# Altium schematic symbol library Microchip PIC16.SchLib: 1803 symbols (part 60 of 63) (continued)
## PIC16LF1847T-I/SS (continued)
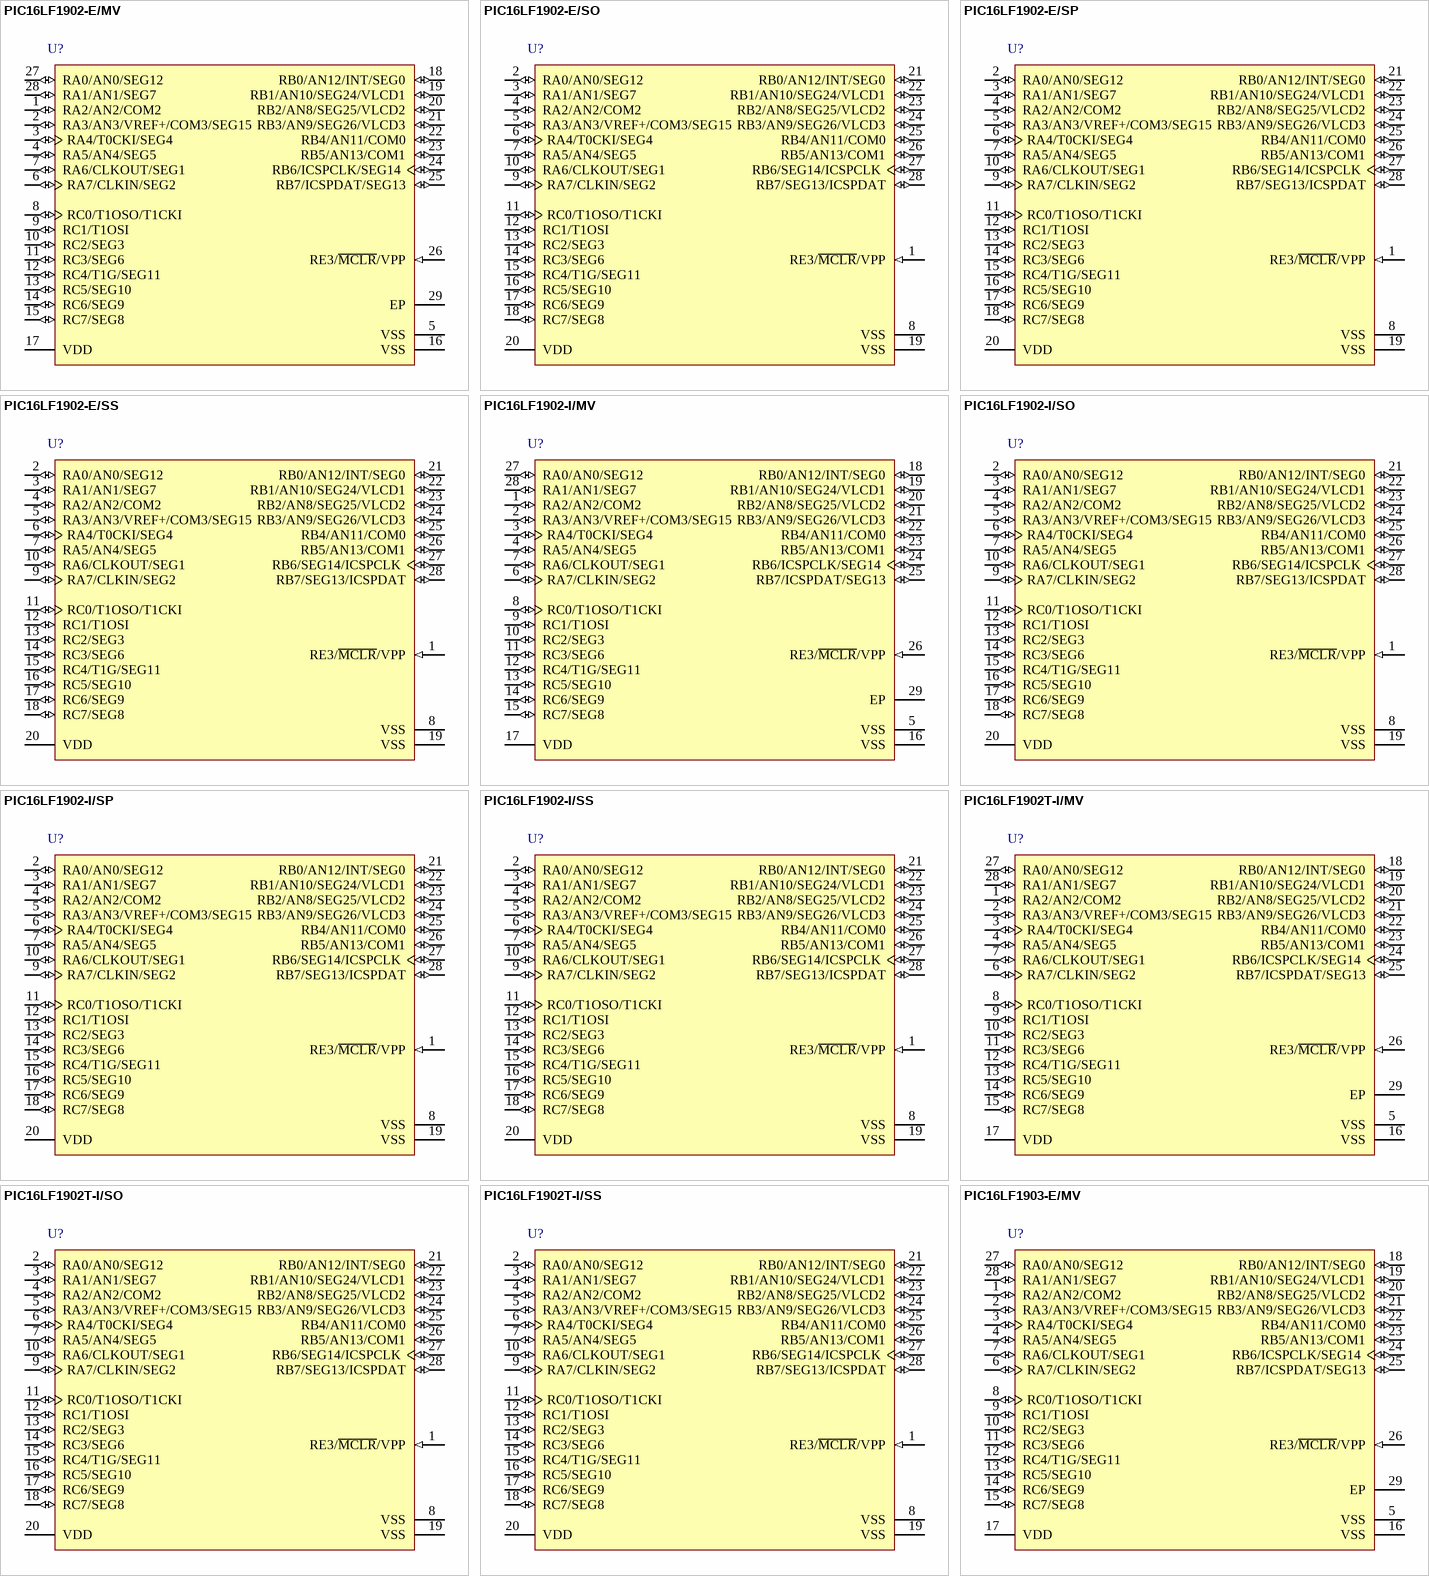
[diagram p94: symbols PIC16LF1902-E/MV to PIC16LF1903-E/MV]

## PIC16LF1902-E/MV
designator U?
Flash-Based, 8-Bit CMOS MCU with LCD Driver and nanoWatt XLP Technology, 20 MHz, 25 I/O, -40 to 125 degC, 28-pin UQFN (MV28), Tube; Manufacturer: Microchip; PartNumber: PIC16LF1902-E/MV; # of A/D Channels: 11; I/O Pins: 25; Internal Oscillator: 16 MHz, 31 kHz; Max. CPU Speed MHz: 20; Memory Type: Flash; Operation Voltage Range: 1.8V - 3.6V; Program Memory KBytes: 3.5; Program Memory KWords: 2; RAM: 128; Timers: 1 - 8-bit, 1 - 16-bit; Populated: Yes; DatasheetVersion: Rev. B; PackageVersion: C04-152A, 04/2013; PackageReference: UQFN-MV28; PackageDescription: 28-Lead Plastic Ultra Thin Quad Flat, Body 4 x 4 mm, Pitch 0.4 mm; Supplier 1: Digi-Key; Supplier Part Number 1: PIC16LF1902-E/MV-ND; Packing: TUBE; RoHS: TRUE; Mounting Technology: Surface Mount; ComponentLink1Description: Datasheet; ComponentLink1URL: http://ww1.microchip.com/downloads/en/DeviceDoc/41455B.pdf; ComponentLink2Description: Package Specification; ComponentLink2URL: http://www.microchip.com/stellent/groups/techpub_sg/documents/packagingspec/en012702.pdf; ComponentLink3Description: URL Link1; ComponentLink3URL: Product URL:http://www.microchip.com/datasheet/PIC16LF1902
footprint MCHP-UQFN-MV28_N (QFN, 28-Leads, Body 4x4mm, Pitch 0.4mm, Thermal Pad 2.65x2.65mm, IPC Medium Density)
footprint MCHP-UQFN-MV28_L (QFN, 28-Leads, Body 4x4mm, Pitch 0.4mm, Thermal Pad 2.65x2.65mm, IPC High Density)
footprint MCHP-UQFN-MV28_M (QFN, 28-Leads, Body 4x4mm, Pitch 0.4mm, Thermal Pad 2.65x2.65mm, IPC Low Density)
pins: 1 RA2/AN2/COM2 (io), 2 RA3/AN3/VREF+/COM3/SEG15 (io), 3 RA4/T0CKI/SEG4 (io), 4 RA5/AN4/SEG5 (io), 5 VSS (power) "Ground reference.", 6 RA7/CLKIN/SEG2 (io), 7 RA6/CLKOUT/SEG1 (io), 8 RC0/T1OSO/T1CKI (io), 9 RC1/T1OSI (io), 10 RC2/SEG3 (io), 11 RC3/SEG6 (io), 12 RC4/T1G/SEG11 (io), 13 RC5/SEG10 (io), 14 RC6/SEG9 (io), 15 RC7/SEG8 (io), 16 VSS (power) "Ground reference.", 17 VDD (power) "Positive supply.", 18 RB0/AN12/INT/SEG0 (io), 19 RB1/AN10/SEG24/VLCD1 (io), 20 RB2/AN8/SEG25/VLCD2 (io), 21 RB3/AN9/SEG26/VLCD3 (io), 22 RB4/AN11/COM0 (io), 23 RB5/AN13/COM1 (io), 24 RB6/ICSPCLK/SEG14 (io), 25 RB7/ICSPDAT/SEG13 (io), 26 RE3/~{MCLR}/VPP (in), 27 RA0/AN0/SEG12 (io), 28 RA1/AN1/SEG7 (io), 29 EP

## PIC16LF1902-E/SO
designator U?
Flash-Based, 8-Bit CMOS MCU with LCD Driver and nanoWatt XLP Technology, 20 MHz, 25 I/O, -40 to 125 degC, 28-pin SOIC (SO28), Tube; Manufacturer: Microchip; PartNumber: PIC16LF1902-E/SO; # of A/D Channels: 11; I/O Pins: 25; Internal Oscillator: 16 MHz, 32 kHz; Max. CPU Speed MHz: 20; Memory Type: Flash; Operation Voltage Range: 1.8V - 3.6V; Program Memory KBytes: 3.5; Program Memory KWords: 2; RAM: 128; Timers: 1 - 8-bit, 1 - 16-bit; Populated: Yes; DatasheetVersion: Rev. B; PackageVersion: C04-052C, 12/2012; PackageReference: SOIC-SO28; PackageDescription: 28-Lead Plastic Small Outline, 17.9 x 7.5 mm Body, 1.27 mm Pitch; Supplier 1: Digi-Key; Supplier Part Number 1: PIC16LF1902-E/SO-ND; Packing: TUBE; RoHS: TRUE; Mounting Technology: Surface Mount; ComponentLink1Description: Datasheet; ComponentLink1URL: http://ww1.microchip.com/downloads/en/DeviceDoc/41455B.pdf; ComponentLink2Description: Package Specification; ComponentLink2URL: http://www.microchip.com/stellent/groups/techpub_sg/documents/packagingspec/en012702.pdf; ComponentLink3Description: URL Link1; ComponentLink3URL: Product URL:http://www.microchip.com/datasheet/PIC16LF1902
footprint MCHP-SOIC-SO28_N (SOIC, 28-Leads, Body 17.9x7.5mm, Pitch 1.27mm, IPC Medium Density)
footprint MCHP-SOIC-SO28_L (SOIC, 28-Leads, Body 17.9x7.5mm, Pitch 1.27mm, IPC High Density)
footprint MCHP-SOIC-SO28_M (SOIC, 28-Leads, Body 17.9x7.5mm, Pitch 1.27mm, IPC Low Density)
pins: 1 RE3/~{MCLR}/VPP (in), 2 RA0/AN0/SEG12 (io), 3 RA1/AN1/SEG7 (io), 4 RA2/AN2/COM2 (io), 5 RA3/AN3/VREF+/COM3/SEG15 (io), 6 RA4/T0CKI/SEG4 (io), 7 RA5/AN4/SEG5 (io), 8 VSS (power) "Ground reference.", 9 RA7/CLKIN/SEG2 (io), 10 RA6/CLKOUT/SEG1 (io), 11 RC0/T1OSO/T1CKI (io), 12 RC1/T1OSI (io), 13 RC2/SEG3 (io), 14 RC3/SEG6 (io), 15 RC4/T1G/SEG11 (io), 16 RC5/SEG10 (io), 17 RC6/SEG9 (io), 18 RC7/SEG8 (io), 19 VSS (power) "Ground reference.", 20 VDD (power) "Positive supply.", 21 RB0/AN12/INT/SEG0 (io), 22 RB1/AN10/SEG24/VLCD1 (io), 23 RB2/AN8/SEG25/VLCD2 (io), 24 RB3/AN9/SEG26/VLCD3 (io), 25 RB4/AN11/COM0 (io), 26 RB5/AN13/COM1 (io), 27 RB6/SEG14/ICSPCLK (io), 28 RB7/SEG13/ICSPDAT (io)

## PIC16LF1902-E/SP
designator U?
Flash-Based, 8-Bit CMOS MCU with LCD Driver and nanoWatt XLP Technology, 20 MHz, 25 I/O, -40 to 125 degC, 28-pin SPDIP (SP28), Tube; Manufacturer: Microchip; PartNumber: PIC16LF1902-E/SP; # of A/D Channels: 11; I/O Pins: 25; Internal Oscillator: 16 MHz, 32 kHz; Max. CPU Speed MHz: 20; Memory Type: Flash; Operation Voltage Range: 1.8V - 3.6V; Program Memory KBytes: 3.5; Program Memory KWords: 2; RAM: 128; Timers: 1 - 8-bit, 1 - 16-bit; Populated: Yes; DatasheetVersion: Rev. B; PackageVersion: C04-070B, 12/2012; PackageReference: SPDIP-SP28; PackageDescription: 28-Lead Plastic Dual In-Line, 34.86 x 6.79 mm Body, 2.54 mm Pitch; Supplier 1: Digi-Key; Supplier Part Number 1: PIC16LF1902-E/SP-ND; Packing: TUBE; RoHS: TRUE; Mounting Technology: Through Hole; ComponentLink1Description: Datasheet; ComponentLink1URL: http://ww1.microchip.com/downloads/en/DeviceDoc/41455B.pdf; ComponentLink2Description: Package Specification; ComponentLink2URL: http://www.microchip.com/stellent/groups/techpub_sg/documents/packagingspec/en012702.pdf; ComponentLink3Description: URL Link1; ComponentLink3URL: Product URL:http://www.microchip.com/datasheet/PIC16LF1902
footprint MCHP-SPDIP-SP28 (DIP, 28-Leads, Body 34.86x6.79mm, Pitch 2.54mm)
pins: 1 RE3/~{MCLR}/VPP (in), 2 RA0/AN0/SEG12 (io), 3 RA1/AN1/SEG7 (io), 4 RA2/AN2/COM2 (io), 5 RA3/AN3/VREF+/COM3/SEG15 (io), 6 RA4/T0CKI/SEG4 (io), 7 RA5/AN4/SEG5 (io), 8 VSS (power) "Ground reference.", 9 RA7/CLKIN/SEG2 (io), 10 RA6/CLKOUT/SEG1 (io), 11 RC0/T1OSO/T1CKI (io), 12 RC1/T1OSI (io), 13 RC2/SEG3 (io), 14 RC3/SEG6 (io), 15 RC4/T1G/SEG11 (io), 16 RC5/SEG10 (io), 17 RC6/SEG9 (io), 18 RC7/SEG8 (io), 19 VSS (power) "Ground reference.", 20 VDD (power) "Positive supply.", 21 RB0/AN12/INT/SEG0 (io), 22 RB1/AN10/SEG24/VLCD1 (io), 23 RB2/AN8/SEG25/VLCD2 (io), 24 RB3/AN9/SEG26/VLCD3 (io), 25 RB4/AN11/COM0 (io), 26 RB5/AN13/COM1 (io), 27 RB6/SEG14/ICSPCLK (io), 28 RB7/SEG13/ICSPDAT (io)

## PIC16LF1902-E/SS
designator U?
Flash-Based, 8-Bit CMOS MCU with LCD Driver and nanoWatt XLP Technology, 20 MHz, 25 I/O, -40 to 125 degC, 28-pin SSOP (SS28), Tube; Manufacturer: Microchip; PartNumber: PIC16LF1902-E/SS; # of A/D Channels: 11; I/O Pins: 25; Internal Oscillator: 16 MHz, 32 kHz; Max. CPU Speed MHz: 20; Memory Type: Flash; Operation Voltage Range: 1.8V - 3.6V; Program Memory KBytes: 3.5; Program Memory KWords: 2; RAM: 128; Timers: 1 - 8-bit, 1 - 16-bit; Populated: Yes; DatasheetVersion: Rev. B; PackageVersion: C04-073B, 12/2012; PackageReference: SSOP-SS28; PackageDescription: 28-Lead Plastic Shrink Small Outline, 10.2 x 5.3 mm Body, 0.65 mm Pitch; Supplier 1: Digi-Key; Supplier Part Number 1: PIC16LF1902-E/SS-ND; Packing: TUBE; RoHS: TRUE; Mounting Technology: Surface Mount; ComponentLink1Description: Datasheet; ComponentLink1URL: http://ww1.microchip.com/downloads/en/DeviceDoc/41455B.pdf; ComponentLink2Description: Package Specification; ComponentLink2URL: http://www.microchip.com/stellent/groups/techpub_sg/documents/packagingspec/en012702.pdf; ComponentLink3Description: URL Link1; ComponentLink3URL: Product URL:http://www.microchip.com/datasheet/PIC16LF1902
footprint MCHP-SSOP-SS28_N (SOP, 28-Leads, Body 10.2x5.3mm, Pitch 0.65mm, IPC Medium Density)
footprint MCHP-SSOP-SS28_L (SOP, 28-Leads, Body 10.2x5.3mm, Pitch 0.65mm, IPC High Density)
footprint MCHP-SSOP-SS28_M (SOP, 28-Leads, Body 10.2x5.3mm, Pitch 0.65mm, IPC Low Density)
pins: 1 RE3/~{MCLR}/VPP (in), 2 RA0/AN0/SEG12 (io), 3 RA1/AN1/SEG7 (io), 4 RA2/AN2/COM2 (io), 5 RA3/AN3/VREF+/COM3/SEG15 (io), 6 RA4/T0CKI/SEG4 (io), 7 RA5/AN4/SEG5 (io), 8 VSS (power) "Ground reference.", 9 RA7/CLKIN/SEG2 (io), 10 RA6/CLKOUT/SEG1 (io), 11 RC0/T1OSO/T1CKI (io), 12 RC1/T1OSI (io), 13 RC2/SEG3 (io), 14 RC3/SEG6 (io), 15 RC4/T1G/SEG11 (io), 16 RC5/SEG10 (io), 17 RC6/SEG9 (io), 18 RC7/SEG8 (io), 19 VSS (power) "Ground reference.", 20 VDD (power) "Positive supply.", 21 RB0/AN12/INT/SEG0 (io), 22 RB1/AN10/SEG24/VLCD1 (io), 23 RB2/AN8/SEG25/VLCD2 (io), 24 RB3/AN9/SEG26/VLCD3 (io), 25 RB4/AN11/COM0 (io), 26 RB5/AN13/COM1 (io), 27 RB6/SEG14/ICSPCLK (io), 28 RB7/SEG13/ICSPDAT (io)

## PIC16LF1902-I/MV
designator U?
Flash-Based, 8-Bit CMOS MCU with LCD Driver and nanoWatt XLP Technology, 20 MHz, 25 I/O, -40 to 85 degC, 28-pin UQFN (MV28), Tube; Manufacturer: Microchip; PartNumber: PIC16LF1902-I/MV; # of A/D Channels: 11; I/O Pins: 25; Internal Oscillator: 16 MHz, 32 kHz; Max. CPU Speed MHz: 20; Memory Type: Flash; Operation Voltage Range: 1.8V - 3.6V; Program Memory KBytes: 3.5; Program Memory KWords: 2; RAM: 128; Timers: 1 - 8-bit, 1 - 16-bit; Populated: Yes; DatasheetVersion: Rev. B; PackageVersion: C04-152A, 04/2013; PackageReference: UQFN-MV28; PackageDescription: 28-Lead Plastic Ultra Thin Quad Flat, Body 4 x 4 mm, Pitch 0.4 mm; Supplier 1: Digi-Key; Supplier Part Number 1: PIC16LF1902-I/MV-ND; Packing: TUBE; RoHS: TRUE; Mounting Technology: Surface Mount; ComponentLink1Description: Datasheet; ComponentLink1URL: http://ww1.microchip.com/downloads/en/DeviceDoc/41455B.pdf; ComponentLink2Description: Package Specification; ComponentLink2URL: http://www.microchip.com/stellent/groups/techpub_sg/documents/packagingspec/en012702.pdf; ComponentLink3Description: URL Link1; ComponentLink3URL: Product URL:http://www.microchip.com/datasheet/PIC16LF1902
footprint MCHP-UQFN-MV28_N (QFN, 28-Leads, Body 4x4mm, Pitch 0.4mm, Thermal Pad 2.65x2.65mm, IPC Medium Density)
footprint MCHP-UQFN-MV28_L (QFN, 28-Leads, Body 4x4mm, Pitch 0.4mm, Thermal Pad 2.65x2.65mm, IPC High Density)
footprint MCHP-UQFN-MV28_M (QFN, 28-Leads, Body 4x4mm, Pitch 0.4mm, Thermal Pad 2.65x2.65mm, IPC Low Density)
pins: 1 RA2/AN2/COM2 (io), 2 RA3/AN3/VREF+/COM3/SEG15 (io), 3 RA4/T0CKI/SEG4 (io), 4 RA5/AN4/SEG5 (io), 5 VSS (power) "Ground reference.", 6 RA7/CLKIN/SEG2 (io), 7 RA6/CLKOUT/SEG1 (io), 8 RC0/T1OSO/T1CKI (io), 9 RC1/T1OSI (io), 10 RC2/SEG3 (io), 11 RC3/SEG6 (io), 12 RC4/T1G/SEG11 (io), 13 RC5/SEG10 (io), 14 RC6/SEG9 (io), 15 RC7/SEG8 (io), 16 VSS (power) "Ground reference.", 17 VDD (power) "Positive supply.", 18 RB0/AN12/INT/SEG0 (io), 19 RB1/AN10/SEG24/VLCD1 (io), 20 RB2/AN8/SEG25/VLCD2 (io), 21 RB3/AN9/SEG26/VLCD3 (io), 22 RB4/AN11/COM0 (io), 23 RB5/AN13/COM1 (io), 24 RB6/ICSPCLK/SEG14 (io), 25 RB7/ICSPDAT/SEG13 (io), 26 RE3/~{MCLR}/VPP (in), 27 RA0/AN0/SEG12 (io), 28 RA1/AN1/SEG7 (io), 29 EP

## PIC16LF1902-I/SO
designator U?
Flash-Based, 8-Bit CMOS MCU with LCD Driver and nanoWatt XLP Technology, 20 MHz, 25 I/O, -40 to 85 degC, 28-pin SOIC (SO28), Tube; Manufacturer: Microchip; PartNumber: PIC16LF1902-I/SO; # of A/D Channels: 11; I/O Pins: 25; Internal Oscillator: 16 MHz, 32 kHz; Max. CPU Speed MHz: 20; Memory Type: Flash; Operation Voltage Range: 1.8V - 3.6V; Program Memory KBytes: 3.5; Program Memory KWords: 2; RAM: 128; Timers: 1 - 8-bit, 1 - 16-bit; Populated: Yes; DatasheetVersion: Rev. B; PackageVersion: C04-052C, 12/2012; PackageReference: SOIC-SO28; PackageDescription: 28-Lead Plastic Small Outline, 17.9 x 7.5 mm Body, 1.27 mm Pitch; Supplier 1: Digi-Key; Supplier Part Number 1: PIC16LF1902-I/SO-ND; Packing: TUBE; RoHS: TRUE; Mounting Technology: Surface Mount; ComponentLink1Description: Datasheet; ComponentLink1URL: http://ww1.microchip.com/downloads/en/DeviceDoc/41455B.pdf; ComponentLink2Description: Package Specification; ComponentLink2URL: http://www.microchip.com/stellent/groups/techpub_sg/documents/packagingspec/en012702.pdf; ComponentLink3Description: URL Link1; ComponentLink3URL: Product URL:http://www.microchip.com/datasheet/PIC16LF1902
footprint MCHP-SOIC-SO28_N (SOIC, 28-Leads, Body 17.9x7.5mm, Pitch 1.27mm, IPC Medium Density)
footprint MCHP-SOIC-SO28_L (SOIC, 28-Leads, Body 17.9x7.5mm, Pitch 1.27mm, IPC High Density)
footprint MCHP-SOIC-SO28_M (SOIC, 28-Leads, Body 17.9x7.5mm, Pitch 1.27mm, IPC Low Density)
pins: 1 RE3/~{MCLR}/VPP (in), 2 RA0/AN0/SEG12 (io), 3 RA1/AN1/SEG7 (io), 4 RA2/AN2/COM2 (io), 5 RA3/AN3/VREF+/COM3/SEG15 (io), 6 RA4/T0CKI/SEG4 (io), 7 RA5/AN4/SEG5 (io), 8 VSS (power) "Ground reference.", 9 RA7/CLKIN/SEG2 (io), 10 RA6/CLKOUT/SEG1 (io), 11 RC0/T1OSO/T1CKI (io), 12 RC1/T1OSI (io), 13 RC2/SEG3 (io), 14 RC3/SEG6 (io), 15 RC4/T1G/SEG11 (io), 16 RC5/SEG10 (io), 17 RC6/SEG9 (io), 18 RC7/SEG8 (io), 19 VSS (power) "Ground reference.", 20 VDD (power) "Positive supply.", 21 RB0/AN12/INT/SEG0 (io), 22 RB1/AN10/SEG24/VLCD1 (io), 23 RB2/AN8/SEG25/VLCD2 (io), 24 RB3/AN9/SEG26/VLCD3 (io), 25 RB4/AN11/COM0 (io), 26 RB5/AN13/COM1 (io), 27 RB6/SEG14/ICSPCLK (io), 28 RB7/SEG13/ICSPDAT (io)

## PIC16LF1902-I/SP
designator U?
Flash-Based, 8-Bit CMOS MCU with LCD Driver and nanoWatt XLP Technology, 20 MHz, 25 I/O, -40 to 85 degC, 28-pin SPDIP (SP28), Tube; Manufacturer: Microchip; PartNumber: PIC16LF1902-I/SP; # of A/D Channels: 11; I/O Pins: 25; Internal Oscillator: 16 MHz, 32 kHz; Max. CPU Speed MHz: 20; Memory Type: Flash; Operation Voltage Range: 1.8V - 3.6V; Program Memory KBytes: 3.5; Program Memory KWords: 2; RAM: 128; Timers: 1 - 8-bit, 1 - 16-bit; Populated: Yes; DatasheetVersion: Rev. B; PackageVersion: C04-070B, 12/2012; PackageReference: SPDIP-SP28; PackageDescription: 28-Lead Plastic Dual In-Line, 34.86 x 6.79 mm Body, 2.54 mm Pitch; Supplier 1: Digi-Key; Supplier Part Number 1: PIC16LF1902-I/SP-ND; Packing: TUBE; RoHS: TRUE; Mounting Technology: Through Hole; ComponentLink1Description: Datasheet; ComponentLink1URL: http://ww1.microchip.com/downloads/en/DeviceDoc/41455B.pdf; ComponentLink2Description: Package Specification; ComponentLink2URL: http://www.microchip.com/stellent/groups/techpub_sg/documents/packagingspec/en012702.pdf; ComponentLink3Description: URL Link1; ComponentLink3URL: Product URL:http://www.microchip.com/datasheet/PIC16LF1902
footprint MCHP-SPDIP-SP28 (DIP, 28-Leads, Body 34.86x6.79mm, Pitch 2.54mm)
pins: 1 RE3/~{MCLR}/VPP (in), 2 RA0/AN0/SEG12 (io), 3 RA1/AN1/SEG7 (io), 4 RA2/AN2/COM2 (io), 5 RA3/AN3/VREF+/COM3/SEG15 (io), 6 RA4/T0CKI/SEG4 (io), 7 RA5/AN4/SEG5 (io), 8 VSS (power) "Ground reference.", 9 RA7/CLKIN/SEG2 (io), 10 RA6/CLKOUT/SEG1 (io), 11 RC0/T1OSO/T1CKI (io), 12 RC1/T1OSI (io), 13 RC2/SEG3 (io), 14 RC3/SEG6 (io), 15 RC4/T1G/SEG11 (io), 16 RC5/SEG10 (io), 17 RC6/SEG9 (io), 18 RC7/SEG8 (io), 19 VSS (power) "Ground reference.", 20 VDD (power) "Positive supply.", 21 RB0/AN12/INT/SEG0 (io), 22 RB1/AN10/SEG24/VLCD1 (io), 23 RB2/AN8/SEG25/VLCD2 (io), 24 RB3/AN9/SEG26/VLCD3 (io), 25 RB4/AN11/COM0 (io), 26 RB5/AN13/COM1 (io), 27 RB6/SEG14/ICSPCLK (io), 28 RB7/SEG13/ICSPDAT (io)

## PIC16LF1902-I/SS
designator U?
Flash-Based, 8-Bit CMOS MCU with LCD Driver and nanoWatt XLP Technology, 20 MHz, 25 I/O, -40 to 85 degC, 28-pin SSOP (SS28), Tube; Manufacturer: Microchip; PartNumber: PIC16LF1902-I/SS; # of A/D Channels: 11; I/O Pins: 25; Internal Oscillator: 16 MHz, 32 kHz; Max. CPU Speed MHz: 20; Memory Type: Flash; Operation Voltage Range: 1.8V - 3.6V; Program Memory KBytes: 3.5; Program Memory KWords: 2; RAM: 128; Timers: 1 - 8-bit, 1 - 16-bit; Populated: Yes; DatasheetVersion: Rev. B; PackageVersion: C04-073B, 12/2012; PackageReference: SSOP-SS28; PackageDescription: 28-Lead Plastic Shrink Small Outline, 10.2 x 5.3 mm Body, 0.65 mm Pitch; Supplier 1: Digi-Key; Supplier Part Number 1: PIC16LF1902-I/SS-ND; Packing: TUBE; RoHS: TRUE; Mounting Technology: Surface Mount; ComponentLink1Description: Datasheet; ComponentLink1URL: http://ww1.microchip.com/downloads/en/DeviceDoc/41455B.pdf; ComponentLink2Description: Package Specification; ComponentLink2URL: http://www.microchip.com/stellent/groups/techpub_sg/documents/packagingspec/en012702.pdf; ComponentLink3Description: URL Link1; ComponentLink3URL: Product URL:http://www.microchip.com/datasheet/PIC16LF1902
footprint MCHP-SSOP-SS28_N (SOP, 28-Leads, Body 10.2x5.3mm, Pitch 0.65mm, IPC Medium Density)
footprint MCHP-SSOP-SS28_L (SOP, 28-Leads, Body 10.2x5.3mm, Pitch 0.65mm, IPC High Density)
footprint MCHP-SSOP-SS28_M (SOP, 28-Leads, Body 10.2x5.3mm, Pitch 0.65mm, IPC Low Density)
pins: 1 RE3/~{MCLR}/VPP (in), 2 RA0/AN0/SEG12 (io), 3 RA1/AN1/SEG7 (io), 4 RA2/AN2/COM2 (io), 5 RA3/AN3/VREF+/COM3/SEG15 (io), 6 RA4/T0CKI/SEG4 (io), 7 RA5/AN4/SEG5 (io), 8 VSS (power) "Ground reference.", 9 RA7/CLKIN/SEG2 (io), 10 RA6/CLKOUT/SEG1 (io), 11 RC0/T1OSO/T1CKI (io), 12 RC1/T1OSI (io), 13 RC2/SEG3 (io), 14 RC3/SEG6 (io), 15 RC4/T1G/SEG11 (io), 16 RC5/SEG10 (io), 17 RC6/SEG9 (io), 18 RC7/SEG8 (io), 19 VSS (power) "Ground reference.", 20 VDD (power) "Positive supply.", 21 RB0/AN12/INT/SEG0 (io), 22 RB1/AN10/SEG24/VLCD1 (io), 23 RB2/AN8/SEG25/VLCD2 (io), 24 RB3/AN9/SEG26/VLCD3 (io), 25 RB4/AN11/COM0 (io), 26 RB5/AN13/COM1 (io), 27 RB6/SEG14/ICSPCLK (io), 28 RB7/SEG13/ICSPDAT (io)

## PIC16LF1902T-I/MV
designator U?
Flash-Based, 8-Bit CMOS MCU with LCD Driver and nanoWatt XLP Technology, 20 MHz, 25 I/O, -40 to 85 degC, 28-pin UQFN (MV28), Tape and Reel; Manufacturer: Microchip; PartNumber: PIC16LF1902T-I/MV; # of A/D Channels: 11; I/O Pins: 25; Internal Oscillator: 16 MHz, 31 kHz; Max. CPU Speed MHz: 20; Memory Type: Flash; Operation Voltage Range: 1.8V - 3.6V; Packing: T/R; Program Memory KBytes: 3.5; Program Memory KWords: 2; RAM: 128; Timers: 1 - 8-bit, 1 - 16-bit; Populated: Yes; DatasheetVersion: Rev. B; PackageVersion: C04-152A, 04/2013; PackageReference: UQFN-MV28; PackageDescription: 28-Lead Plastic Ultra Thin Quad Flat, Body 4 x 4 mm, Pitch 0.4 mm; Supplier 1: Digi-Key; Supplier Part Number 1: PIC16LF1902T-I/MV-ND; RoHS: TRUE; Mounting Technology: Surface Mount; ComponentLink1Description: Datasheet; ComponentLink1URL: http://ww1.microchip.com/downloads/en/DeviceDoc/41455B.pdf; ComponentLink2Description: Package Specification; ComponentLink2URL: http://www.microchip.com/stellent/groups/techpub_sg/documents/packagingspec/en012702.pdf; ComponentLink3Description: URL Link1; ComponentLink3URL: Product URL:http://www.microchip.com/datasheet/PIC16LF1902
footprint MCHP-UQFN-MV28_N (QFN, 28-Leads, Body 4x4mm, Pitch 0.4mm, Thermal Pad 2.65x2.65mm, IPC Medium Density)
footprint MCHP-UQFN-MV28_L (QFN, 28-Leads, Body 4x4mm, Pitch 0.4mm, Thermal Pad 2.65x2.65mm, IPC High Density)
footprint MCHP-UQFN-MV28_M (QFN, 28-Leads, Body 4x4mm, Pitch 0.4mm, Thermal Pad 2.65x2.65mm, IPC Low Density)
pins: 1 RA2/AN2/COM2 (io), 2 RA3/AN3/VREF+/COM3/SEG15 (io), 3 RA4/T0CKI/SEG4 (io), 4 RA5/AN4/SEG5 (io), 5 VSS (power) "Ground reference.", 6 RA7/CLKIN/SEG2 (io), 7 RA6/CLKOUT/SEG1 (io), 8 RC0/T1OSO/T1CKI (io), 9 RC1/T1OSI (io), 10 RC2/SEG3 (io), 11 RC3/SEG6 (io), 12 RC4/T1G/SEG11 (io), 13 RC5/SEG10 (io), 14 RC6/SEG9 (io), 15 RC7/SEG8 (io), 16 VSS (power) "Ground reference.", 17 VDD (power) "Positive supply.", 18 RB0/AN12/INT/SEG0 (io), 19 RB1/AN10/SEG24/VLCD1 (io), 20 RB2/AN8/SEG25/VLCD2 (io), 21 RB3/AN9/SEG26/VLCD3 (io), 22 RB4/AN11/COM0 (io), 23 RB5/AN13/COM1 (io), 24 RB6/ICSPCLK/SEG14 (io), 25 RB7/ICSPDAT/SEG13 (io), 26 RE3/~{MCLR}/VPP (in), 27 RA0/AN0/SEG12 (io), 28 RA1/AN1/SEG7 (io), 29 EP

## PIC16LF1902T-I/SO
designator U?
Flash-Based, 8-Bit CMOS MCU with LCD Driver and nanoWatt XLP Technology, 20 MHz, 25 I/O, -40 to 85 degC, 28-pin SOIC (SO28), Tape and Reel; Manufacturer: Microchip; PartNumber: PIC16LF1902T-I/SO; # of A/D Channels: 11; I/O Pins: 25; Internal Oscillator: 16 MHz, 31 kHz; Max. CPU Speed MHz: 20; Memory Type: Flash; Operation Voltage Range: 1.8V - 3.6V; Packing: T/R; Program Memory KBytes: 3.5; Program Memory KWords: 2; RAM: 128; Timers: 1 - 8-bit, 1 - 16-bit; Populated: Yes; DatasheetVersion: Rev. B; PackageVersion: C04-052C, 12/2012; PackageReference: SOIC-SO28; PackageDescription: 28-Lead Plastic Small Outline, 17.9 x 7.5 mm Body, 1.27 mm Pitch; Supplier 1: Digi-Key; Supplier Part Number 1: PIC16LF1902T-I/SO-ND; RoHS: TRUE; Mounting Technology: Surface Mount; ComponentLink1Description: Datasheet; ComponentLink1URL: http://ww1.microchip.com/downloads/en/DeviceDoc/41455B.pdf; ComponentLink2Description: Package Specification; ComponentLink2URL: http://www.microchip.com/stellent/groups/techpub_sg/documents/packagingspec/en012702.pdf; ComponentLink3Description: URL Link1; ComponentLink3URL: Product URL:http://www.microchip.com/datasheet/PIC16LF1902
footprint MCHP-SOIC-SO28_N (SOIC, 28-Leads, Body 17.9x7.5mm, Pitch 1.27mm, IPC Medium Density)
footprint MCHP-SOIC-SO28_L (SOIC, 28-Leads, Body 17.9x7.5mm, Pitch 1.27mm, IPC High Density)
footprint MCHP-SOIC-SO28_M (SOIC, 28-Leads, Body 17.9x7.5mm, Pitch 1.27mm, IPC Low Density)
pins: 1 RE3/~{MCLR}/VPP (in), 2 RA0/AN0/SEG12 (io), 3 RA1/AN1/SEG7 (io), 4 RA2/AN2/COM2 (io), 5 RA3/AN3/VREF+/COM3/SEG15 (io), 6 RA4/T0CKI/SEG4 (io), 7 RA5/AN4/SEG5 (io), 8 VSS (power) "Ground reference.", 9 RA7/CLKIN/SEG2 (io), 10 RA6/CLKOUT/SEG1 (io), 11 RC0/T1OSO/T1CKI (io), 12 RC1/T1OSI (io), 13 RC2/SEG3 (io), 14 RC3/SEG6 (io), 15 RC4/T1G/SEG11 (io), 16 RC5/SEG10 (io), 17 RC6/SEG9 (io), 18 RC7/SEG8 (io), 19 VSS (power) "Ground reference.", 20 VDD (power) "Positive supply.", 21 RB0/AN12/INT/SEG0 (io), 22 RB1/AN10/SEG24/VLCD1 (io), 23 RB2/AN8/SEG25/VLCD2 (io), 24 RB3/AN9/SEG26/VLCD3 (io), 25 RB4/AN11/COM0 (io), 26 RB5/AN13/COM1 (io), 27 RB6/SEG14/ICSPCLK (io), 28 RB7/SEG13/ICSPDAT (io)

## PIC16LF1902T-I/SS
designator U?
Flash-Based, 8-Bit CMOS MCU with LCD Driver and nanoWatt XLP Technology, 20 MHz, 25 I/O, -40 to 85 degC, 28-pin SSOP (SS28), Tape and Reel; Manufacturer: Microchip; PartNumber: PIC16LF1902T-I/SS; # of A/D Channels: 11; I/O Pins: 25; Internal Oscillator: 16 MHz, 31 kHz; Max. CPU Speed MHz: 20; Memory Type: Flash; Operation Voltage Range: 1.8V - 3.6V; Packing: T/R; Program Memory KBytes: 3.5; Program Memory KWords: 2; RAM: 128; Timers: 1 - 8-bit, 1 - 16-bit; Populated: Yes; DatasheetVersion: Rev. B; PackageVersion: C04-073B, 12/2012; PackageReference: SSOP-SS28; PackageDescription: 28-Lead Plastic Shrink Small Outline, 10.2 x 5.3 mm Body, 0.65 mm Pitch; Supplier 1: Digi-Key; Supplier Part Number 1: PIC16LF1902T-I/SS-ND; RoHS: TRUE; Mounting Technology: Surface Mount; ComponentLink1Description: Datasheet; ComponentLink1URL: http://ww1.microchip.com/downloads/en/DeviceDoc/41455B.pdf; ComponentLink2Description: Package Specification; ComponentLink2URL: http://www.microchip.com/stellent/groups/techpub_sg/documents/packagingspec/en012702.pdf; ComponentLink3Description: URL Link1; ComponentLink3URL: Product URL:http://www.microchip.com/datasheet/PIC16LF1902
footprint MCHP-SSOP-SS28_N (SOP, 28-Leads, Body 10.2x5.3mm, Pitch 0.65mm, IPC Medium Density)
footprint MCHP-SSOP-SS28_L (SOP, 28-Leads, Body 10.2x5.3mm, Pitch 0.65mm, IPC High Density)
footprint MCHP-SSOP-SS28_M (SOP, 28-Leads, Body 10.2x5.3mm, Pitch 0.65mm, IPC Low Density)
pins: 1 RE3/~{MCLR}/VPP (in), 2 RA0/AN0/SEG12 (io), 3 RA1/AN1/SEG7 (io), 4 RA2/AN2/COM2 (io), 5 RA3/AN3/VREF+/COM3/SEG15 (io), 6 RA4/T0CKI/SEG4 (io), 7 RA5/AN4/SEG5 (io), 8 VSS (power) "Ground reference.", 9 RA7/CLKIN/SEG2 (io), 10 RA6/CLKOUT/SEG1 (io), 11 RC0/T1OSO/T1CKI (io), 12 RC1/T1OSI (io), 13 RC2/SEG3 (io), 14 RC3/SEG6 (io), 15 RC4/T1G/SEG11 (io), 16 RC5/SEG10 (io), 17 RC6/SEG9 (io), 18 RC7/SEG8 (io), 19 VSS (power) "Ground reference.", 20 VDD (power) "Positive supply.", 21 RB0/AN12/INT/SEG0 (io), 22 RB1/AN10/SEG24/VLCD1 (io), 23 RB2/AN8/SEG25/VLCD2 (io), 24 RB3/AN9/SEG26/VLCD3 (io), 25 RB4/AN11/COM0 (io), 26 RB5/AN13/COM1 (io), 27 RB6/SEG14/ICSPCLK (io), 28 RB7/SEG13/ICSPDAT (io)

## PIC16LF1903-E/MV
designator U?
Flash-Based, 8-Bit CMOS MCU with LCD Driver and nanoWatt XLP Technology, 20 MHz, 24 I/O, -40 to 125 degC, 28-pin UQFN (MV28), Tube; Manufacturer: Microchip; PartNumber: PIC16LF1903-E/MV; # of A/D Channels: 11; I/O Pins: 24; Internal Oscillator: 16 MHz, 31.25 kHz; Max. CPU Speed MHz: 20; Memory Type: Flash; Operation Voltage Range: 1.8V - 3.6V; Program Memory KBytes: 7; Program Memory KWords: 4; RAM: 256; Timers: 1 - 8-bit, 1 - 16-bit; Populated: Yes; DatasheetVersion: Rev. B; PackageVersion: C04-152A, 04/2013; PackageReference: UQFN-MV28; PackageDescription: 28-Lead Plastic Ultra Thin Quad Flat, Body 4 x 4 mm, Pitch 0.4 mm; Supplier 1: Digi-Key; Supplier Part Number 1: PIC16LF1903-E/MV-ND; Packing: TUBE; RoHS: TRUE; Mounting Technology: Surface Mount; ComponentLink1Description: Datasheet; ComponentLink1URL: http://ww1.microchip.com/downloads/en/DeviceDoc/41455B.pdf; ComponentLink2Description: Package Specification; ComponentLink2URL: http://www.microchip.com/stellent/groups/techpub_sg/documents/packagingspec/en012702.pdf; ComponentLink3Description: URL Link1; ComponentLink3URL: Product URL:http://www.microchip.com/datasheet/PIC16LF1903
footprint MCHP-UQFN-MV28_N (QFN, 28-Leads, Body 4x4mm, Pitch 0.4mm, Thermal Pad 2.65x2.65mm, IPC Medium Density)
footprint MCHP-UQFN-MV28_L (QFN, 28-Leads, Body 4x4mm, Pitch 0.4mm, Thermal Pad 2.65x2.65mm, IPC High Density)
footprint MCHP-UQFN-MV28_M (QFN, 28-Leads, Body 4x4mm, Pitch 0.4mm, Thermal Pad 2.65x2.65mm, IPC Low Density)
pins: 1 RA2/AN2/COM2 (io), 2 RA3/AN3/VREF+/COM3/SEG15 (io), 3 RA4/T0CKI/SEG4 (io), 4 RA5/AN4/SEG5 (io), 5 VSS (power) "Ground reference.", 6 RA7/CLKIN/SEG2 (io), 7 RA6/CLKOUT/SEG1 (io), 8 RC0/T1OSO/T1CKI (io), 9 RC1/T1OSI (io), 10 RC2/SEG3 (io), 11 RC3/SEG6 (io), 12 RC4/T1G/SEG11 (io), 13 RC5/SEG10 (io), 14 RC6/SEG9 (io), 15 RC7/SEG8 (io), 16 VSS (power) "Ground reference.", 17 VDD (power) "Positive supply.", 18 RB0/AN12/INT/SEG0 (io), 19 RB1/AN10/SEG24/VLCD1 (io), 20 RB2/AN8/SEG25/VLCD2 (io), 21 RB3/AN9/SEG26/VLCD3 (io), 22 RB4/AN11/COM0 (io), 23 RB5/AN13/COM1 (io), 24 RB6/ICSPCLK/SEG14 (io), 25 RB7/ICSPDAT/SEG13 (io), 26 RE3/~{MCLR}/VPP (in), 27 RA0/AN0/SEG12 (io), 28 RA1/AN1/SEG7 (io), 29 EP

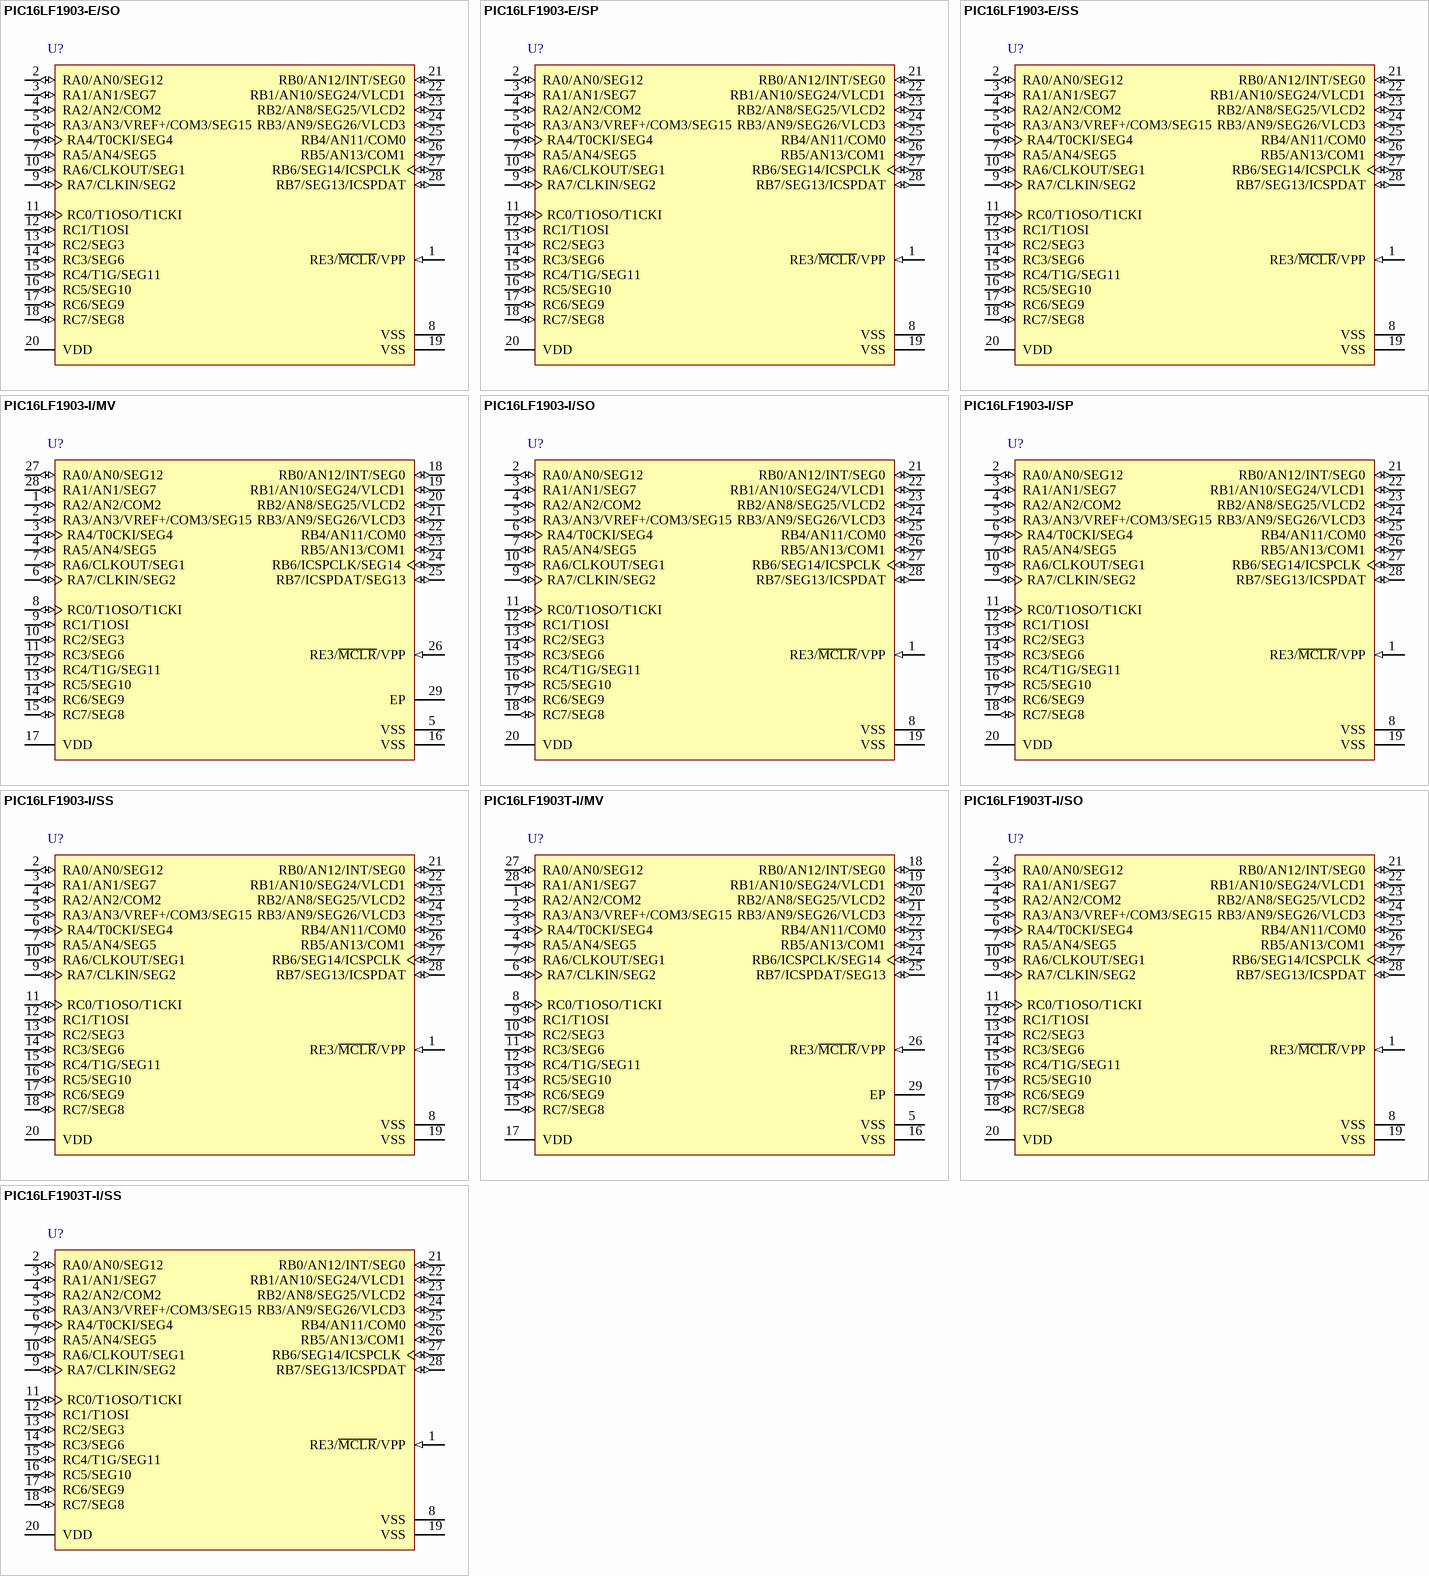
[diagram p95: symbols PIC16LF1903-E/SO to PIC16LF1903T-I/SS]

## PIC16LF1903-E/SO
designator U?
Flash-Based, 8-Bit CMOS MCU with LCD Driver and nanoWatt XLP Technology, 20 MHz, 24 I/O, -40 to 125 degC, 28-pin SOIC (SO28), Tube; Manufacturer: Microchip; PartNumber: PIC16LF1903-E/SO; # of A/D Channels: 11; I/O Pins: 24; Internal Oscillator: 16 MHz, 31.25 kHz; Max. CPU Speed MHz: 20; Memory Type: Flash; Operation Voltage Range: 1.8V - 3.6V; Program Memory KBytes: 7; Program Memory KWords: 4; RAM: 256; Timers: 1 - 8-bit, 1 - 16-bit; Populated: Yes; DatasheetVersion: Rev. B; PackageVersion: C04-052C, 12/2012; PackageReference: SOIC-SO28; PackageDescription: 28-Lead Plastic Small Outline, 17.9 x 7.5 mm Body, 1.27 mm Pitch; Supplier 1: Digi-Key; Supplier Part Number 1: PIC16LF1903-E/SO-ND; Packing: TUBE; RoHS: TRUE; Mounting Technology: Surface Mount; ComponentLink1Description: Datasheet; ComponentLink1URL: http://ww1.microchip.com/downloads/en/DeviceDoc/41455B.pdf; ComponentLink2Description: Package Specification; ComponentLink2URL: http://www.microchip.com/stellent/groups/techpub_sg/documents/packagingspec/en012702.pdf; ComponentLink3Description: URL Link1; ComponentLink3URL: Product URL:http://www.microchip.com/datasheet/PIC16LF1903
footprint MCHP-SOIC-SO28_N (SOIC, 28-Leads, Body 17.9x7.5mm, Pitch 1.27mm, IPC Medium Density)
footprint MCHP-SOIC-SO28_L (SOIC, 28-Leads, Body 17.9x7.5mm, Pitch 1.27mm, IPC High Density)
footprint MCHP-SOIC-SO28_M (SOIC, 28-Leads, Body 17.9x7.5mm, Pitch 1.27mm, IPC Low Density)
pins: 1 RE3/~{MCLR}/VPP (in), 2 RA0/AN0/SEG12 (io), 3 RA1/AN1/SEG7 (io), 4 RA2/AN2/COM2 (io), 5 RA3/AN3/VREF+/COM3/SEG15 (io), 6 RA4/T0CKI/SEG4 (io), 7 RA5/AN4/SEG5 (io), 8 VSS (power) "Ground reference.", 9 RA7/CLKIN/SEG2 (io), 10 RA6/CLKOUT/SEG1 (io), 11 RC0/T1OSO/T1CKI (io), 12 RC1/T1OSI (io), 13 RC2/SEG3 (io), 14 RC3/SEG6 (io), 15 RC4/T1G/SEG11 (io), 16 RC5/SEG10 (io), 17 RC6/SEG9 (io), 18 RC7/SEG8 (io), 19 VSS (power) "Ground reference.", 20 VDD (power) "Positive supply.", 21 RB0/AN12/INT/SEG0 (io), 22 RB1/AN10/SEG24/VLCD1 (io), 23 RB2/AN8/SEG25/VLCD2 (io), 24 RB3/AN9/SEG26/VLCD3 (io), 25 RB4/AN11/COM0 (io), 26 RB5/AN13/COM1 (io), 27 RB6/SEG14/ICSPCLK (io), 28 RB7/SEG13/ICSPDAT (io)

## PIC16LF1903-E/SP
designator U?
Flash-Based, 8-Bit CMOS MCU with LCD Driver and nanoWatt XLP Technology, 20 MHz, 24 I/O, -40 to 125 degC, 28-pin SPDIP (SP28), Tube; Manufacturer: Microchip; PartNumber: PIC16LF1903-E/SP; # of A/D Channels: 11; I/O Pins: 24; Internal Oscillator: 16 MHz, 31.25 kHz; Max. CPU Speed MHz: 20; Memory Type: Flash; Operation Voltage Range: 1.8V - 3.6V; Program Memory KBytes: 7; Program Memory KWords: 4; RAM: 256; Timers: 1 - 8-bit, 1 - 16-bit; Populated: Yes; DatasheetVersion: Rev. B; PackageVersion: C04-070B, 12/2012; PackageReference: SPDIP-SP28; PackageDescription: 28-Lead Plastic Dual In-Line, 34.86 x 6.79 mm Body, 2.54 mm Pitch; Supplier 1: Digi-Key; Supplier Part Number 1: PIC16LF1903-E/SP-ND; Packing: TUBE; RoHS: TRUE; Mounting Technology: Through Hole; ComponentLink1Description: Datasheet; ComponentLink1URL: http://ww1.microchip.com/downloads/en/DeviceDoc/41455B.pdf; ComponentLink2Description: Package Specification; ComponentLink2URL: http://www.microchip.com/stellent/groups/techpub_sg/documents/packagingspec/en012702.pdf; ComponentLink3Description: URL Link1; ComponentLink3URL: Product URL:http://www.microchip.com/datasheet/PIC16LF1903
footprint MCHP-SPDIP-SP28 (DIP, 28-Leads, Body 34.86x6.79mm, Pitch 2.54mm)
pins: 1 RE3/~{MCLR}/VPP (in), 2 RA0/AN0/SEG12 (io), 3 RA1/AN1/SEG7 (io), 4 RA2/AN2/COM2 (io), 5 RA3/AN3/VREF+/COM3/SEG15 (io), 6 RA4/T0CKI/SEG4 (io), 7 RA5/AN4/SEG5 (io), 8 VSS (power) "Ground reference.", 9 RA7/CLKIN/SEG2 (io), 10 RA6/CLKOUT/SEG1 (io), 11 RC0/T1OSO/T1CKI (io), 12 RC1/T1OSI (io), 13 RC2/SEG3 (io), 14 RC3/SEG6 (io), 15 RC4/T1G/SEG11 (io), 16 RC5/SEG10 (io), 17 RC6/SEG9 (io), 18 RC7/SEG8 (io), 19 VSS (power) "Ground reference.", 20 VDD (power) "Positive supply.", 21 RB0/AN12/INT/SEG0 (io), 22 RB1/AN10/SEG24/VLCD1 (io), 23 RB2/AN8/SEG25/VLCD2 (io), 24 RB3/AN9/SEG26/VLCD3 (io), 25 RB4/AN11/COM0 (io), 26 RB5/AN13/COM1 (io), 27 RB6/SEG14/ICSPCLK (io), 28 RB7/SEG13/ICSPDAT (io)

## PIC16LF1903-E/SS
designator U?
Flash-Based, 8-Bit CMOS MCU with LCD Driver and nanoWatt XLP Technology, 20 MHz, 24 I/O, -40 to 125 degC, 28-pin SSOP (SS28), Tube; Manufacturer: Microchip; PartNumber: PIC16LF1903-E/SS; # of A/D Channels: 11; I/O Pins: 24; Internal Oscillator: 16 MHz, 31.25 kHz; Max. CPU Speed MHz: 20; Memory Type: Flash; Operation Voltage Range: 1.8V - 3.6V; Program Memory KBytes: 7; Program Memory KWords: 4; RAM: 256; Timers: 1 - 8-bit, 1 - 16-bit; Populated: Yes; DatasheetVersion: Rev. B; PackageVersion: C04-073B, 12/2012; PackageReference: SSOP-SS28; PackageDescription: 28-Lead Plastic Shrink Small Outline, 10.2 x 5.3 mm Body, 0.65 mm Pitch; Supplier 1: Digi-Key; Supplier Part Number 1: PIC16LF1903-E/SS-ND; Packing: TUBE; RoHS: TRUE; Mounting Technology: Surface Mount; ComponentLink1Description: Datasheet; ComponentLink1URL: http://ww1.microchip.com/downloads/en/DeviceDoc/41455B.pdf; ComponentLink2Description: Package Specification; ComponentLink2URL: http://www.microchip.com/stellent/groups/techpub_sg/documents/packagingspec/en012702.pdf; ComponentLink3Description: URL Link1; ComponentLink3URL: Product URL:http://www.microchip.com/datasheet/PIC16LF1903
footprint MCHP-SSOP-SS28_N (SOP, 28-Leads, Body 10.2x5.3mm, Pitch 0.65mm, IPC Medium Density)
footprint MCHP-SSOP-SS28_L (SOP, 28-Leads, Body 10.2x5.3mm, Pitch 0.65mm, IPC High Density)
footprint MCHP-SSOP-SS28_M (SOP, 28-Leads, Body 10.2x5.3mm, Pitch 0.65mm, IPC Low Density)
pins: 1 RE3/~{MCLR}/VPP (in), 2 RA0/AN0/SEG12 (io), 3 RA1/AN1/SEG7 (io), 4 RA2/AN2/COM2 (io), 5 RA3/AN3/VREF+/COM3/SEG15 (io), 6 RA4/T0CKI/SEG4 (io), 7 RA5/AN4/SEG5 (io), 8 VSS (power) "Ground reference.", 9 RA7/CLKIN/SEG2 (io), 10 RA6/CLKOUT/SEG1 (io), 11 RC0/T1OSO/T1CKI (io), 12 RC1/T1OSI (io), 13 RC2/SEG3 (io), 14 RC3/SEG6 (io), 15 RC4/T1G/SEG11 (io), 16 RC5/SEG10 (io), 17 RC6/SEG9 (io), 18 RC7/SEG8 (io), 19 VSS (power) "Ground reference.", 20 VDD (power) "Positive supply.", 21 RB0/AN12/INT/SEG0 (io), 22 RB1/AN10/SEG24/VLCD1 (io), 23 RB2/AN8/SEG25/VLCD2 (io), 24 RB3/AN9/SEG26/VLCD3 (io), 25 RB4/AN11/COM0 (io), 26 RB5/AN13/COM1 (io), 27 RB6/SEG14/ICSPCLK (io), 28 RB7/SEG13/ICSPDAT (io)

## PIC16LF1903-I/MV
designator U?
Flash-Based, 8-Bit CMOS MCU with LCD Driver and nanoWatt XLP Technology, 20 MHz, 24 I/O, -40 to 85 degC, 28-pin UQFN (MV28), Tube; Manufacturer: Microchip; PartNumber: PIC16LF1903-I/MV; # of A/D Channels: 11; I/O Pins: 24; Internal Oscillator: 16 MHz, 31.25 kHz; Max. CPU Speed MHz: 20; Memory Type: Flash; Operation Voltage Range: 1.8V - 3.6V; Program Memory KBytes: 7; Program Memory KWords: 4; RAM: 256; Timers: 1 - 8-bit, 1 - 16-bit; Populated: Yes; DatasheetVersion: Rev. B; PackageVersion: C04-152A, 04/2013; PackageReference: UQFN-MV28; PackageDescription: 28-Lead Plastic Ultra Thin Quad Flat, Body 4 x 4 mm, Pitch 0.4 mm; Supplier 1: Digi-Key; Supplier Part Number 1: PIC16LF1903-I/MV-ND; Packing: TUBE; RoHS: TRUE; Mounting Technology: Surface Mount; ComponentLink1Description: Datasheet; ComponentLink1URL: http://ww1.microchip.com/downloads/en/DeviceDoc/41455B.pdf; ComponentLink2Description: Package Specification; ComponentLink2URL: http://www.microchip.com/stellent/groups/techpub_sg/documents/packagingspec/en012702.pdf; ComponentLink3Description: URL Link1; ComponentLink3URL: Product URL:http://www.microchip.com/datasheet/PIC16LF1903
footprint MCHP-UQFN-MV28_N (QFN, 28-Leads, Body 4x4mm, Pitch 0.4mm, Thermal Pad 2.65x2.65mm, IPC Medium Density)
footprint MCHP-UQFN-MV28_L (QFN, 28-Leads, Body 4x4mm, Pitch 0.4mm, Thermal Pad 2.65x2.65mm, IPC High Density)
footprint MCHP-UQFN-MV28_M (QFN, 28-Leads, Body 4x4mm, Pitch 0.4mm, Thermal Pad 2.65x2.65mm, IPC Low Density)
pins: 1 RA2/AN2/COM2 (io), 2 RA3/AN3/VREF+/COM3/SEG15 (io), 3 RA4/T0CKI/SEG4 (io), 4 RA5/AN4/SEG5 (io), 5 VSS (power) "Ground reference.", 6 RA7/CLKIN/SEG2 (io), 7 RA6/CLKOUT/SEG1 (io), 8 RC0/T1OSO/T1CKI (io), 9 RC1/T1OSI (io), 10 RC2/SEG3 (io), 11 RC3/SEG6 (io), 12 RC4/T1G/SEG11 (io), 13 RC5/SEG10 (io), 14 RC6/SEG9 (io), 15 RC7/SEG8 (io), 16 VSS (power) "Ground reference.", 17 VDD (power) "Positive supply.", 18 RB0/AN12/INT/SEG0 (io), 19 RB1/AN10/SEG24/VLCD1 (io), 20 RB2/AN8/SEG25/VLCD2 (io), 21 RB3/AN9/SEG26/VLCD3 (io), 22 RB4/AN11/COM0 (io), 23 RB5/AN13/COM1 (io), 24 RB6/ICSPCLK/SEG14 (io), 25 RB7/ICSPDAT/SEG13 (io), 26 RE3/~{MCLR}/VPP (in), 27 RA0/AN0/SEG12 (io), 28 RA1/AN1/SEG7 (io), 29 EP

## PIC16LF1903-I/SO
designator U?
Flash-Based, 8-Bit CMOS MCU with LCD Driver and nanoWatt XLP Technology, 20 MHz, 24 I/O, -40 to 85 degC, 28-pin SOIC (SO28), Tube; Manufacturer: Microchip; PartNumber: PIC16LF1903-I/SO; # of A/D Channels: 11; I/O Pins: 24; Internal Oscillator: 16 MHz, 31.25 kHz; Max. CPU Speed MHz: 20; Memory Type: Flash; Operation Voltage Range: 1.8V - 3.6V; Program Memory KBytes: 7; Program Memory KWords: 4; RAM: 256; Timers: 1 - 8-bit, 1 - 16-bit; Populated: Yes; DatasheetVersion: Rev. B; PackageVersion: C04-052C, 12/2012; PackageReference: SOIC-SO28; PackageDescription: 28-Lead Plastic Small Outline, 17.9 x 7.5 mm Body, 1.27 mm Pitch; Supplier 1: Digi-Key; Supplier Part Number 1: PIC16LF1903-I/SO-ND; Packing: TUBE; RoHS: TRUE; Mounting Technology: Surface Mount; ComponentLink1Description: Datasheet; ComponentLink1URL: http://ww1.microchip.com/downloads/en/DeviceDoc/41455B.pdf; ComponentLink2Description: Package Specification; ComponentLink2URL: http://www.microchip.com/stellent/groups/techpub_sg/documents/packagingspec/en012702.pdf; ComponentLink3Description: URL Link1; ComponentLink3URL: Product URL:http://www.microchip.com/datasheet/PIC16LF1903
footprint MCHP-SOIC-SO28_N (SOIC, 28-Leads, Body 17.9x7.5mm, Pitch 1.27mm, IPC Medium Density)
footprint MCHP-SOIC-SO28_L (SOIC, 28-Leads, Body 17.9x7.5mm, Pitch 1.27mm, IPC High Density)
footprint MCHP-SOIC-SO28_M (SOIC, 28-Leads, Body 17.9x7.5mm, Pitch 1.27mm, IPC Low Density)
pins: 1 RE3/~{MCLR}/VPP (in), 2 RA0/AN0/SEG12 (io), 3 RA1/AN1/SEG7 (io), 4 RA2/AN2/COM2 (io), 5 RA3/AN3/VREF+/COM3/SEG15 (io), 6 RA4/T0CKI/SEG4 (io), 7 RA5/AN4/SEG5 (io), 8 VSS (power) "Ground reference.", 9 RA7/CLKIN/SEG2 (io), 10 RA6/CLKOUT/SEG1 (io), 11 RC0/T1OSO/T1CKI (io), 12 RC1/T1OSI (io), 13 RC2/SEG3 (io), 14 RC3/SEG6 (io), 15 RC4/T1G/SEG11 (io), 16 RC5/SEG10 (io), 17 RC6/SEG9 (io), 18 RC7/SEG8 (io), 19 VSS (power) "Ground reference.", 20 VDD (power) "Positive supply.", 21 RB0/AN12/INT/SEG0 (io), 22 RB1/AN10/SEG24/VLCD1 (io), 23 RB2/AN8/SEG25/VLCD2 (io), 24 RB3/AN9/SEG26/VLCD3 (io), 25 RB4/AN11/COM0 (io), 26 RB5/AN13/COM1 (io), 27 RB6/SEG14/ICSPCLK (io), 28 RB7/SEG13/ICSPDAT (io)

## PIC16LF1903-I/SP
designator U?
Flash-Based, 8-Bit CMOS MCU with LCD Driver and nanoWatt XLP Technology, 20 MHz, 24 I/O, -40 to 85 degC, 28-pin SPDIP (SP28), Tube; Manufacturer: Microchip; PartNumber: PIC16LF1903-I/SP; # of A/D Channels: 11; I/O Pins: 24; Internal Oscillator: 16 MHz, 31.25 kHz; Max. CPU Speed MHz: 20; Memory Type: Flash; Operation Voltage Range: 1.8V - 3.6V; Program Memory KBytes: 7; Program Memory KWords: 4; RAM: 256; Timers: 1 - 8-bit, 1 - 16-bit; Populated: Yes; DatasheetVersion: Rev. B; PackageVersion: C04-070B, 12/2012; PackageReference: SPDIP-SP28; PackageDescription: 28-Lead Plastic Dual In-Line, 34.86 x 6.79 mm Body, 2.54 mm Pitch; Supplier 1: Digi-Key; Supplier Part Number 1: PIC16LF1903-I/SP-ND; Packing: TUBE; RoHS: TRUE; Mounting Technology: Through Hole; ComponentLink1Description: Datasheet; ComponentLink1URL: http://ww1.microchip.com/downloads/en/DeviceDoc/41455B.pdf; ComponentLink2Description: Package Specification; ComponentLink2URL: http://www.microchip.com/stellent/groups/techpub_sg/documents/packagingspec/en012702.pdf; ComponentLink3Description: URL Link1; ComponentLink3URL: Product URL:http://www.microchip.com/datasheet/PIC16LF1903
footprint MCHP-SPDIP-SP28 (DIP, 28-Leads, Body 34.86x6.79mm, Pitch 2.54mm)
pins: 1 RE3/~{MCLR}/VPP (in), 2 RA0/AN0/SEG12 (io), 3 RA1/AN1/SEG7 (io), 4 RA2/AN2/COM2 (io), 5 RA3/AN3/VREF+/COM3/SEG15 (io), 6 RA4/T0CKI/SEG4 (io), 7 RA5/AN4/SEG5 (io), 8 VSS (power) "Ground reference.", 9 RA7/CLKIN/SEG2 (io), 10 RA6/CLKOUT/SEG1 (io), 11 RC0/T1OSO/T1CKI (io), 12 RC1/T1OSI (io), 13 RC2/SEG3 (io), 14 RC3/SEG6 (io), 15 RC4/T1G/SEG11 (io), 16 RC5/SEG10 (io), 17 RC6/SEG9 (io), 18 RC7/SEG8 (io), 19 VSS (power) "Ground reference.", 20 VDD (power) "Positive supply.", 21 RB0/AN12/INT/SEG0 (io), 22 RB1/AN10/SEG24/VLCD1 (io), 23 RB2/AN8/SEG25/VLCD2 (io), 24 RB3/AN9/SEG26/VLCD3 (io), 25 RB4/AN11/COM0 (io), 26 RB5/AN13/COM1 (io), 27 RB6/SEG14/ICSPCLK (io), 28 RB7/SEG13/ICSPDAT (io)